# Altium footprint library LimeMicroAltiumLib_pcbLib_r01.PcbLib: 434 footprints (part 28 of 29)
Each footprint in its own frame and in the unit in brackets; x right, y up, seen from the top. Pads: shape width x height; smd on the part's side, far side on the other; paste and mask are expansions set on the pad; w line width, h text height; cw(c..) or ccw(c..) is an arc to the next point about the centre after c.
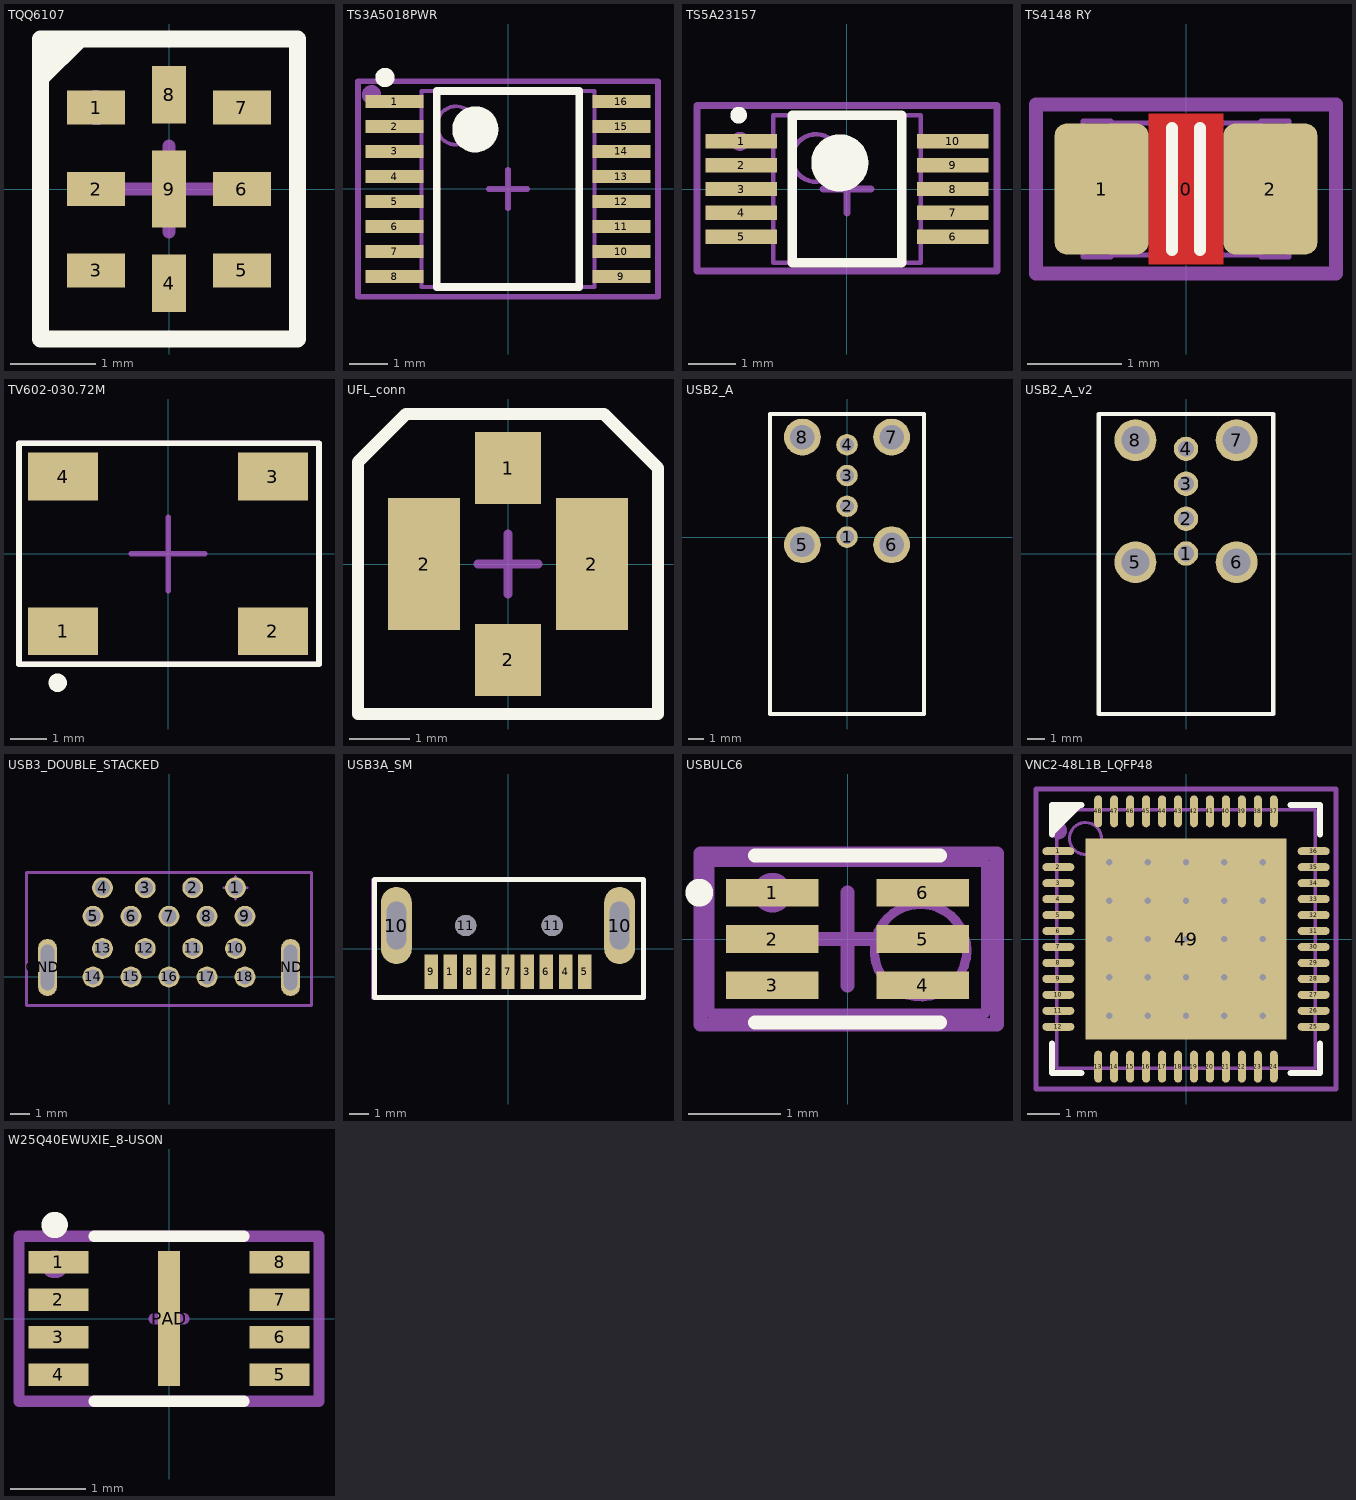
[diagram p27: the footprints below, top view; thin cyan lines are the x and y axes]

## TQQ6107 [mm]
pads (9):
  rect 0.675x0.4 smd mask+0.05: 1(-0.85,0.95) 2(-0.85,0) 3(-0.85,-0.95) 5(0.85,-0.95) 6(0.85,0) 7(0.85,0.95)
  rect 0.4x0.675 smd mask+0.05: 4(0,-1.1) 8(0,1.1)
  rect 0.4x0.9 smd mask+0.05: 9(0,0)
Top Overlay:
  region: -1.5,1.75 -1.5,1.15 -0.9,1.75
  lines w0.2: -1.5,-1.75 1.5,-1.75 1.5,1.75 -1.5,1.75 -1.5,-1.75
Mechanical 15:
  circle w0.2: c-0.85,0.95 r0.103
  lines w0.15: -0.5,0 0.5,0 ; 0,-0.5 0,0.5 ; -1.5,-1.75 -1.5,1.75 1.5,1.75 1.5,-1.75 -1.5,-1.75
  text ".Designator" at 0,0 h0.55
3D body: height 0.99, standoff 0, extent -0.8,0.75 -0.501,1.049
3D body: height 0.98, standoff 0, extent -1,-1.25 1,1.25

## TS3A5018PWR [mm] "TSOP, 16-Leads, Body 5,00x4,40mm, Pitch 0,65mm, IPC Medium Density"
height 1.2
pads (16):
  rect 1.5x0.35 smd mask+0.07: 1(-2.95,2.275) 2(-2.95,1.625) 3(-2.95,0.975) 4(-2.95,0.325) 5(-2.95,-0.325) 6(-2.95,-0.975) 7(-2.95,-1.625) 8(-2.95,-2.275) 9(2.95,-2.275) 10(2.95,-1.625) 11(2.95,-0.975) 12(2.95,-0.325) 13(2.95,0.325) 14(2.95,0.975) 15(2.95,1.625) 16(2.95,2.275)
Top Overlay:
  circle w0.6: c-0.85,1.55 r0.3
  circle w0.25: c-3.2,2.9 r0.125
  lines w0.2: -1.85,-2.55 1.85,-2.55 1.85,2.55 -1.85,2.55 -1.85,-2.55
Mechanical 13:
  circle w0.1: c-1.35,1.65 r0.5
  lines w0.1: -2.25,-2.55 2.25,-2.55 2.25,2.55 -2.25,2.55 -2.25,-2.55
Mechanical 15:
  circle w0.35: c-3.55,2.45 r0.075
  lines w0.15: -0.5,0 0.5,0 ; 0,-0.5 0,0.5 ; -3.9,-2.8 3.9,-2.8 3.9,2.8 -3.9,2.8 -3.9,-2.8
  text ".Designator" at 0,0 h0.55
3D body "User Library-TSSOP-16-1.step": height 1.1, standoff 0, extent -3.2,-2.5 3.2,2.5

## TS5A23157 [mm] "TSSOP, 10-Leads, Body 3,00x3,00mm, Pitch 0,50mm, IPC Medium Density"
height 1.1
pads (10):
  rect 1.5x0.3 smd mask+0.05: 1(-2.225,1) 2(-2.225,0.5) 3(-2.225,0) 4(-2.225,-0.5) 5(-2.225,-1) 6(2.225,-1) 7(2.225,-0.5) 8(2.225,0) 9(2.225,0.5) 10(2.225,1)
Top Overlay:
  circle w0.25: c-2.275,1.55 r0.05
  circle w0.6: c-0.15,0.55 r0.3
  lines w0.2: -1.15,-1.55 -1.15,1.55 1.15,1.55 1.15,-1.55 -1.15,-1.55
Mechanical 13:
  circle w0.1: c-0.65,0.65 r0.5
  lines w0.1: -1.55,-1.55 -1.55,1.55 1.55,1.55 1.55,-1.55 -1.55,-1.55
Mechanical 15:
  circle w0.2: c-2.25,1 r0.1
  lines w0.15: -0.5,0 0.5,0 ; 0,-0.5 0,0.5 ; -3.15,-1.725 -3.15,1.75 3.15,1.75 3.15,-1.725 -3.15,-1.725
  text ".Designator" at 0,0 h0.55
3D body "User Library-MSOP-10-1.step": height 1.05, standoff 0, extent -2.514,-1.5 2.514,1.5
3D body: height 1.1, standoff 0.1, extent -1.55,-1.55 1.55,1.55

## TS4148 RY [mm] "Chip Capacitor, Body 2.0x1.2mm, 0805, IPC Medium Density"
height 1.2
pads (3):
  round 0.254 on Mech15: 0(0,0)
  rrect25% 1x1.4 smd: 1(-0.9,0) 2(0.9,0)
Top Layer:
  pour cut-out: -0.4,0.8 0.4,0.8 0.4,-0.8 -0.4,-0.8
Top Overlay:
  lines w0.127: -0.15,-0.651 -0.15,0.651 ; 0.15,-0.651 0.15,0.651
Mechanical 13:
  lines w0.05: -0.8,-0.705 0.8,-0.705 ; -0.8,0.705 0.8,0.705 ; -1.1,-0.725 -0.8,-0.725 -0.8,0.725 -1.1,0.725 -1.1,-0.725 ; 0.8,-0.725 0.8,0.725 1.1,0.725 1.1,-0.725 0.8,-0.725
Mechanical 15:
  lines w0.15: -1.6,-0.9 1.6,-0.9 1.6,0.9 -1.6,0.9 -1.6,-0.9
  text ".Designator" at 0,0 h0.55
3D body "CAP_0805.STEP": height 1.34, standoff -0.01, extent -1.1,-0.725 1.1,0.725

## TV602-030.72M [mm] "TV602-030.72M Connor Winfield"
pads (4):
  rect 1.9x1.3 smd mask+0.05: 1(-2.85,-2.1) 2(2.85,-2.1) 3(2.85,2.1) 4(-2.85,2.1)
Top Overlay:
  circle w0.3: c-3,-3.5 r0.1
  lines w0.15: -4.05,-3 -4.05,3 4.1,3 4.1,-3 -4.05,-3
Mechanical 15:
  circle w0.3: c-2.85,-2.1 r0.1
  lines w0.15: -1,0 0,0 ; 0,-1 0,0 ; 0,1 0,0 ; 1,0 0,0 ; -4.05,-3 4.1,-3 4.1,3 -4.05,3 -4.05,-3
  text ".Designator" at 0,0 h0.55

## UFL_conn [mm]
pads (4):
  rect 1.1x1.2 smd: 1(0,1.6) 2(0,-1.6)
  rect 1.2x2.2 smd: 2(-1.4,0) 2(1.4,0)
Top Overlay:
  lines w0.2: -2.5,-2.5 -2.5,1.7 -1.7,2.5 1.6,2.5 2.5,1.6 2.5,-2.5 -2.5,-2.5
Top Solder:
  region: -0.55,0.9 -0.8,0.9 -0.8,1.2 -0.55,1.2
  region: 0.8,0.9 0.55,0.9 0.55,1.2 0.8,1.2
  region: 0.8,-1.2 0.55,-1.2 0.55,-0.9 0.8,-0.9
  region: -0.55,-1.2 -0.8,-1.2 -0.8,-0.9 -0.55,-0.9
Mechanical 15:
  lines w0.15: -0.5,0 0.5,0 ; 0,-0.5 0,0.5 ; -2.5,-2.5 2.5,-2.5 2.5,1.6 1.6,2.5 -1.7,2.5 -2.5,1.7 -2.5,-2.5
  text "in" at -0.7,1.3 h0.55
  text ".designator" at 0,0 h0.55
3D body "User Library-U_FL-R-SMT-1.step": height 1.25, standoff -0.01, extent -1.55,-1.5 1.55,1.5

## USB2_A [mm]
pads (8):
  round 1.4 hole 0.9: 1(0,0) 2(0,2) 3(0,4) 4(0,6)
  round 2.4 hole 1.6: 5(-2.9,-0.5) 6(2.9,-0.5) 7(2.9,6.5) 8(-2.9,6.5)
Top Overlay:
  lines w0.254: -5,-11.5 5,-11.5 5,8 -5,8 -5,-11.5
Mechanical 15:
  lines w0.15: -5,-11.5 5,-11.5 5,8 -5,8 -5,-11.5
  text ".Designator" at 0,0 h0.55

## USB2_A_v2 [mm]
pads (8):
  round 1.4 hole 0.9: 1(0,0) 2(0,2) 3(0,4) 4(0,6)
  round 2.4 hole 1.6: 5(-2.9,-0.5) 6(2.9,-0.5) 7(2.9,6.5) 8(-2.9,6.5)
Top Overlay:
  lines w0.254: -5,-9.2 -5,8 5,8 5,-9.2 -5,-9.2
Mechanical 15:
  lines w0.15: -5,-9.2 5,-9.2 5,8 -5,8 -5,-9.2
  text ".Designator" at 0,0 h0.55

## USB3_DOUBLE_STACKED [mm]
pads (20):
  round 1.1 hole 0.8 mask+0.05: 1(3.5,4.7) 2(1.25,4.7) 3(-1.25,4.7) 4(-3.5,4.7) 5(-4,3.2) 6(-2,3.2) 7(0,3.2) 8(2,3.2) 9(4,3.2) 10(3.5,1.5) 11(1.25,1.5) 12(-1.25,1.5) 13(-3.5,1.5) 14(-4,0) 15(-2,0) 16(0,0) 17(2,0) 18(4,0)
  oval 1x3 hole 0.7 slot 2.4 at 90 deg mask+0.05: GND1(-6.4,0.5) GND2(6.4,0.5)
Mechanical 15:
  lines w0.15: 2.9,4.7 3.5,4.7 ; 3.5,4.1 3.5,4.7 ; 3.5,5.3 3.5,4.7 ; 4.1,4.7 3.5,4.7 ; -7.5,-1.5 7.5,-1.5 7.5,5.5 -7.5,5.5 -7.5,-1.5
  text ".Designator" at 0,0 h0.7

## USB3A_SM [mm]
pads (13):
  rect 0.7x1.8 smd: 1(-3,-1.2) 2(-1,-1.2) 3(1,-1.2) 4(3,-1.2) 5(4,-1.2) 6(2,-1.2) 7(0,-1.2) 8(-2,-1.2) 9(-4,-1.2)
  oval 1.6x4 hole 1 slot 2.5 at 90 deg: 10(-5.8,1.2) 10(5.8,1.2)
  round 1.1 hole 1.1 unplated: 11(-2.2,1.2) 11(2.3,1.2)
Top Overlay:
  lines w0.254: -6.95,-2.55 -6.95,3.6 7.05,3.6 7.05,-2.55 -6.95,-2.55
Mechanical 15:
  lines w0.15: -7.05,-2.6 -7.05,3.6 7.1,3.6 7.1,-2.6 -7.05,-2.6
  text ".Designator" at -0.2,0.3 h0.55
3D body "692112030100.stp": height 1.8, standoff -2.7, extent -6,-1.754 6,19

## USBULC6 [mm]
height 1.2
pads (6):
  rect 1x0.3 smd mask+0.05: 1(-0.812,0.5) 2(-0.812,0) 3(-0.812,-0.5) 4(0.813,-0.5) 5(0.813,0) 6(0.813,0.5)
Top Overlay:
  circle w0.25: c-1.6,0.5 r0.025
  lines w0.15: -1,-0.9 1,-0.9 ; -1,0.9 1,0.9
Mechanical 13:
  circle w0.1: c0.788,-0.125 r0.5
  lines w0.1: -1.487,-0.8 1.488,-0.8 1.488,0.825 -1.487,0.825 -1.487,-0.8
Mechanical 15:
  circle w0.35: c-0.812,0.5 r0.038
  lines w0.15: -0.5,0 0.5,0 ; 0,-0.5 0,0.5 ; -1.587,-0.925 1.613,-0.925 1.613,0.925 -1.587,0.925 -1.587,-0.925
  text ".Designator" at 0,0 h0.55
3D body: height 1.5, standoff 0, extent -0.825,-0.5 0.825,0.5

## uSpark_BODY1_MECH [mm]
3D body "1455A1202.stp": height 4.37, standoff -7.63, extent -73.5,-33.291 52.5,36.711
3D body "User Library-SMA Antenna.step": height 81.97, standoff -5, extent 52.475,-10.425 83.375,-0.425
3D body "User Library-SMA Antenna.step": height 81.97, standoff -5, extent 52.475,-24.75 83.375,-14.75
3D body "User Library-SMA Antenna.step": height 81.97, standoff -5, extent 52.475,3.325 83.375,13.325
3D body "User Library-SMA Antenna.step": height 81.97, standoff -5, extent 52.5,17.65 83.4,27.65

## uSpark_BODY_MECH [mm]
3D body "1455A1002.stp": height 9.37, standoff -2.63, extent -53.525,-34.611 52.475,35.391
3D body "User Library-SMA Antenna.step": height 86.97, standoff 0, extent 52.5,17.65 83.4,27.65
3D body "User Library-SMA Antenna.step": height 86.97, standoff 0, extent 52.475,3.325 83.375,13.325
3D body "User Library-SMA Antenna.step": height 86.97, standoff 0, extent 52.475,-24.75 83.375,-14.75
3D body "User Library-SMA Antenna.step": height 86.97, standoff 0, extent 52.475,-10.425 83.375,-0.425

## uSpark_BODY_PANEL_MECH [mm]
3D body "User Library-SMA Antenna.step": height 84.97, standoff -2, extent 52.5,17.65 83.4,27.65
3D body "User Library-SMA Antenna.step": height 84.97, standoff -2, extent 52.475,3.325 83.375,13.325
3D body "User Library-SMA Antenna.step": height 84.97, standoff -2, extent 52.475,-24.75 83.375,-14.75
3D body "User Library-SMA Antenna.step": height 84.97, standoff -2, extent 52.475,-10.425 83.375,-0.425
3D body "User Library-SMA-2.step": height 8.25, standoff -2.25, extent 23.875,17.375 58.875,27.875
3D body "User Library-SMA-2.step": height 8.25, standoff -2.25, extent 23.85,3.05 58.85,13.55
3D body "User Library-SMA-2.step": height 8.25, standoff -2.25, extent 23.85,-10.7 58.85,-0.2
3D body "User Library-SMA-2.step": height 8.25, standoff -2.25, extent 23.85,-25.025 58.85,-14.525
3D body: height 6, standoff 0, extent 50,-26 51.5,29

## VNC2-48L1B_LQFP48 [mm] "VNC2-48L1B chip with LQFP-48 package"
pads (49):
  oval 1x0.25 smd mask+0.05: 1(-4,2.75) 2(-4,2.25) 3(-4,1.75) 4(-4,1.25) 5(-4,0.75) 6(-4,0.25) 7(-4,-0.25) 8(-4,-0.75) 9(-4,-1.25) 10(-4,-1.75) 11(-4,-2.25) 12(-4,-2.75) 25(4,-2.75) 26(4,-2.25) 27(4,-1.75) 28(4,-1.25) 29(4,-0.75) 30(4,-0.25) 31(4,0.25) 32(4,0.75) 33(4,1.25) 34(4,1.75) 35(4,2.25) 36(4,2.75)
  oval 0.25x1 smd mask+0.05: 13(-2.75,-4) 14(-2.25,-4) 15(-1.75,-4) 16(-1.25,-4) 17(-0.75,-4) 18(-0.25,-4) 19(0.25,-4) 20(0.75,-4) 21(1.25,-4) 22(1.75,-4) 23(2.25,-4) 24(2.75,-4) 37(2.75,4) 38(2.25,4) 39(1.75,4) 40(1.25,4) 41(0.75,4) 42(0.25,4) 43(-0.25,4) 44(-0.75,4) 45(-1.25,4) 46(-1.75,4) 47(-2.25,4) 48(-2.75,4)
  rect 6.3x6.3 smd: 49(0,0)
via -2.4,2.4 diameter 0.4 hole 0.2
via -1.2,2.4 diameter 0.4 hole 0.2
via 0,2.4 diameter 0.4 hole 0.2
via 1.2,2.4 diameter 0.4 hole 0.2
via 2.4,2.4 diameter 0.4 hole 0.2
via -2.4,1.2 diameter 0.4 hole 0.2
via -1.2,1.2 diameter 0.4 hole 0.2
via 0,1.2 diameter 0.4 hole 0.2
via 1.2,1.2 diameter 0.4 hole 0.2
via 2.4,1.2 diameter 0.4 hole 0.2
via -2.4,0 diameter 0.4 hole 0.2
via -1.2,0 diameter 0.4 hole 0.2
via 0,0 diameter 0.4 hole 0.2
via 1.2,0 diameter 0.4 hole 0.2
via 2.4,0 diameter 0.4 hole 0.2
via -2.4,-1.2 diameter 0.4 hole 0.2
via -1.2,-1.2 diameter 0.4 hole 0.2
via 0,-1.2 diameter 0.4 hole 0.2
via 1.2,-1.2 diameter 0.4 hole 0.2
via 2.4,-1.2 diameter 0.4 hole 0.2
via -2.4,-2.4 diameter 0.4 hole 0.2
via -1.2,-2.4 diameter 0.4 hole 0.2
via 0,-2.4 diameter 0.4 hole 0.2
via 1.2,-2.4 diameter 0.4 hole 0.2
via 2.4,-2.4 diameter 0.4 hole 0.2
Top Overlay:
  region: -4.2,3.2 -3.2,4.2 -4.2,4.2
  lines w0.2: -4.2,-3.275 -4.2,-4.2 -3.275,-4.2 ; -4.2,3.275 -4.2,4.2 -3.275,4.2 ; 3.275,-4.2 4.2,-4.2 4.2,-3.275 ; 3.275,4.2 4.2,4.2 4.2,3.275
Mechanical 13:
  circle w0.1: c-3.15,3.15 r0.5
  lines w0.1: -4.05,-4.05 -4.05,4.05 4.05,4.05 4.05,-4.05 -4.05,-4.05
Mechanical 15:
  circle w0.35: c-4,3.4 r0.1
  lines w0.15: -0.5,0 0.5,0 ; 0,-0.5 0,0.5 ; -4.7,-4.7 -4.7,4.7 4.7,4.7 4.7,-4.7 -4.7,-4.7
  text ".Designator" at 0,0 h0.55
3D body: height 1, standoff 0, extent -4.05,-4.05 4.05,4.05

## W25Q40EWUXIE_8-USON [mm]
pads (9):
  rect 0.8x0.3 smd mask+0.05: 1(-1.475,0.75) 2(-1.475,0.25) 3(-1.475,-0.25) 4(-1.475,-0.75) 5(1.475,-0.75) 6(1.475,-0.25) 7(1.475,0.25) 8(1.475,0.75)
  rect 0.3x1.8 smd mask+0.05: PAD(0,0)
Top Overlay:
  circle w0.3: c-1.525,1.25 r0.025
  lines w0.15: -1,-1.1 1,-1.1 ; -1,1.1 1,1.1
Mechanical 15:
  circle w0.3: c-1.525,0.725 r0.035
  lines w0.15: -0.2,0 0.2,0 ; 0,-0.2 0,0.2 ; -2,-1.1 -2,1.1 2,1.1 2,-1.1 -2,-1.1
  text ".Designator" at 0,0 h0.55
3D body "User Library-8MA3.step": height 0.6, standoff 0, extent -1.51,-1 1.51,1